# Altium integrated library Integrated_Library-Foxou.IntLib: 69 symbols
Pins are listed as number, name and electrical type; pins without a type are passive.

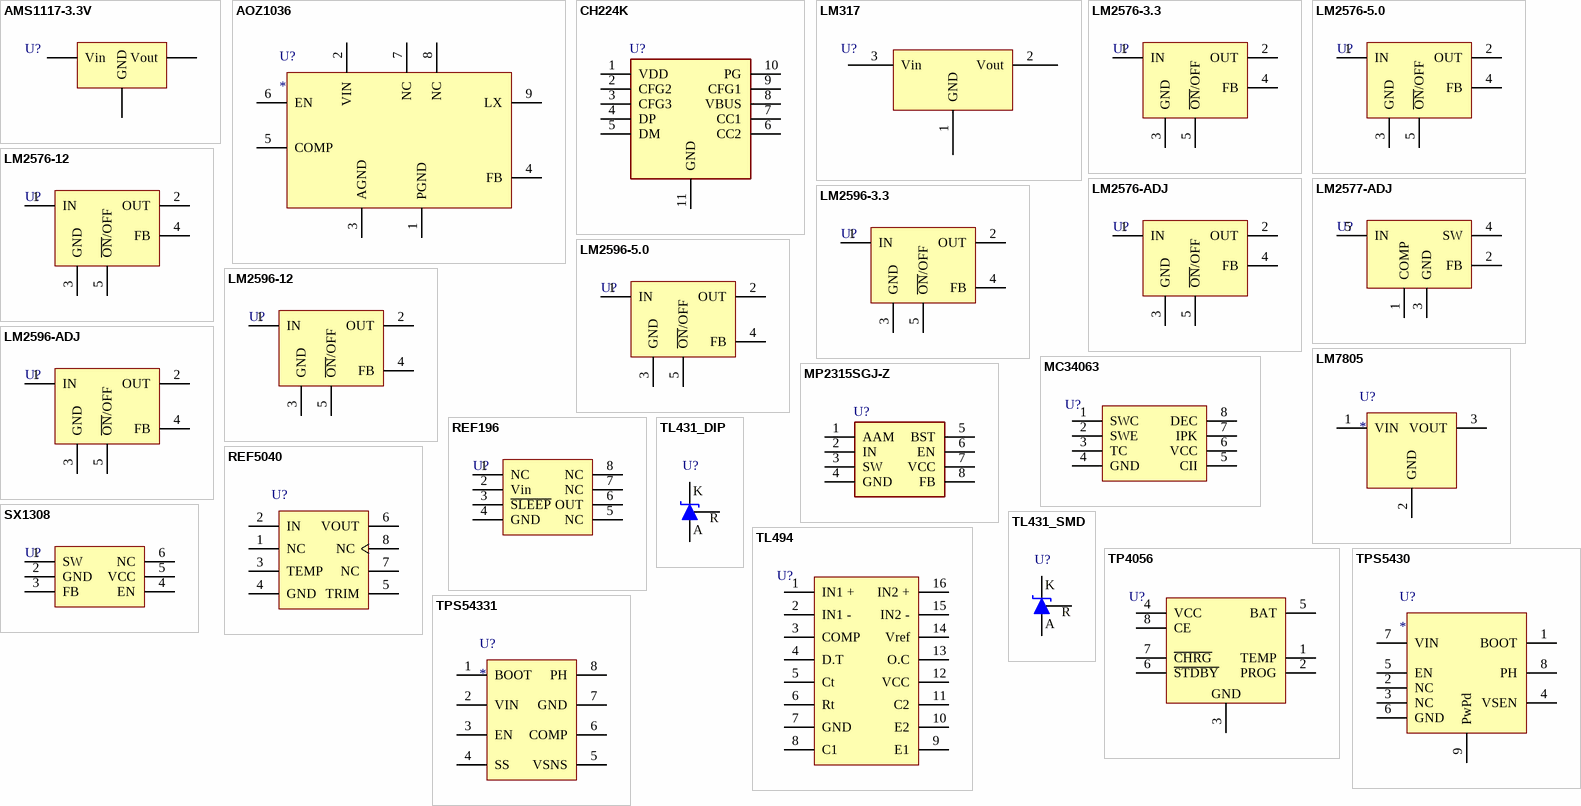
[diagram p0: symbols AMS1117-3.3V to TPS54331]

## AMS1117-3.3V
designator U?
low dropout three-terminal regulators
footprint SOT-223 (Footprint not found)
pins: 1 GND, 2 Vout, 3 Vin

## AOZ1036
designator U?
footprint SOP8-Pad
pins: 1 PGND, 2 VIN, 3 AGND, 4 FB, 5 COMP, 6 EN, 7 NC, 8 NC, 9 LX

## CH224K
designator U?
ESSOP-10 USB ICs ROHS; Manufacturer_Name: WCH; Manufacturer_Part_Number: CH224K; Geometry.Height: 1.8mm; Mouser Part Number: *; Mouser Price/Stock: *; Arrow Part Number: *; Arrow Price/Stock: *; Datasheet Link: https://datasheet.lcsc.com/lcsc/2204251615_WCH-Jiangsu-Qin-Heng-CH224K_C970725.pdf
footprint SOP-10-EP (SOP-8 (Exposed Pad))
pins: 1 VDD, 2 CFG2, 3 CFG3, 4 DP, 5 DM, 6 CC2, 7 CC1, 8 VBUS, 9 CFG1, 10 PG, 11 GND

## LM317
designator U?
footprint TO263
pins: 1 GND, 2 Vout, 3 Vin

## LM2576-3.3
designator U?
DC降压芯片
footprint TO263-5A (263，5脚晶体管)
footprint TO220-5A
pins: 1 IN (power), 2 OUT (power), 3 GND (power), 4 FB, 5 ~{ON}/OFF

## LM2576-5.0
designator U?
DC降压芯片
footprint TO220-5A
footprint TO263-5A (263，5脚晶体管)
pins: 1 IN (power), 2 OUT (power), 3 GND (power), 4 FB, 5 ~{ON}/OFF

## LM2576-12
designator U?
DC降压芯片
footprint TO220-5A
footprint TO263-5A (263，5脚晶体管)
pins: 1 IN (power), 2 OUT (power), 3 GND (power), 4 FB, 5 ~{ON}/OFF

## LM2576-ADJ
designator U?
DC降压芯片
footprint TO220-5A
footprint TO263-5A (263，5脚晶体管)
pins: 1 IN (power), 2 OUT (power), 3 GND (power), 4 FB, 5 ~{ON}/OFF

## LM2577-ADJ
designator U?
DC升压芯片
footprint TO263-5A (263，5脚晶体管)
pins: 1 COMP, 2 FB, 3 GND, 4 SW (power), 5 IN (power)

## LM2596-3.3
designator U?
DC降压芯片
footprint TO263-5A (263，5脚晶体管)
pins: 1 IN (power), 2 OUT (power), 3 GND (power), 4 FB, 5 ~{ON}/OFF

## LM2596-5.0
designator U?
DC降压芯片
footprint TO263-5A (263，5脚晶体管)
pins: 1 IN (power), 2 OUT (power), 3 GND (power), 4 FB, 5 ~{ON}/OFF

## LM2596-12
designator U?
DC降压芯片
footprint TO263-5A (263，5脚晶体管)
pins: 1 IN (power), 2 OUT (power), 3 GND (power), 4 FB, 5 ~{ON}/OFF

## LM2596-ADJ
designator U?
footprint TO263-5A (263，5脚晶体管)
pins: 1 IN (power), 2 OUT (power), 3 GND (power), 4 FB, 5 ~{ON}/OFF

## LM7805
designator U?
footprint TO252 (252晶体管)
pins: 1 VIN, 2 GND, 3 VOUT

## MC34063
designator U?
footprint DIP8
footprint DIP8_SS (DIP8-SMD Socket)
footprint SOP8
pins: 1 SWC, 2 SWE, 3 TC, 4 GND, 5 CII, 6 VCC, 7 IPK, 8 DEC

## MP2315SGJ-Z
designator U?
Switching Voltage Regulators 3A 24V Hi Effc.Sync Step Down Converter; Manufacturer_Name: Monolithic Power Systems (MPS); Manufacturer_Part_Number: MP2315SGJ-Z; Geometry.Height: 1mm; Mouser Part Number: 946-MP2315SGJ-Z; Mouser Price/Stock: https://www.mouser.co.uk/ProductDetail/Monolithic-Power-Systems-MPS/MP2315SGJ-Z?qs=Zwj7mHVHPHQK3n9ExaDQiw%3D%3D; Arrow Part Number: *; Arrow Price/Stock: *; Datasheet Link: https://componentsearchengine.com/Datasheets/1/MP2315SGJ-Z.pdf
footprint TSOT-23-8
pins: 1 AAM, 2 IN, 3 SW, 4 GND, 5 BST, 6 EN, 7 VCC, 8 FB

## REF196
designator U?
3V3基准电压源
footprint SOP8
pins: 1 NC, 2 Vin, 3 ~{SLEEP}, 4 GND, 5 NC, 6 OUT, 7 NC, 8 NC

## REF5040
designator U?
高精度电压基准
footprint SOP8
pins: 1 NC, 2 IN, 3 TEMP, 4 GND, 5 TRIM, 6 VOUT, 7 NC, 8 NC

## SX1308
designator U?
可调升压芯片
footprint SOT23-6
pins: 1 SW, 2 GND, 3 FB, 4 EN, 5 VCC, 6 NC

## TL431_DIP
designator U?
可调基准稳压芯片
pins: A, K, R

## TL431_SMD
designator U?
可调基准稳压芯片
footprint SOT89
pins: A, K, R

## TL494
designator U?
电源管理IC
footprint DIP16
footprint DIP16_SS (DIP16-SMD Socket)
pins: 1 IN1 +, 2 IN1 -, 3 COMP, 4 D.T, 5 Ct, 6 Rt, 7 GND, 8 C1, 9 E1, 10 E2, 11 C2, 12 VCC, 13 O.C, 14 Vref, 15 IN2 -, 16 IN2 +

## TP4056
designator U?
footprint SOP8
pins: 1 TEMP, 2 PROG, 3 GND, 4 VCC, 5 BAT, 6 ~{STDBY}, 7 ~{CHRG}, 8 CE

## TPS5430
designator U?
footprint SOP8-Pad
pins: 1 BOOT, 2 NC, 3 NC, 4 VSEN, 5 EN, 6 GND, 7 VIN, 8 PH, 9 PwPd

## TPS54331
designator U?
footprint SOP8-Pad
pins: 1 BOOT, 2 VIN, 3 EN, 4 SS, 5 VSNS, 6 COMP, 7 GND, 8 PH


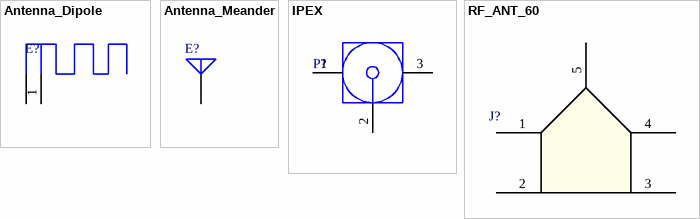
[diagram p1: symbols Antenna_Dipole to RF_ANT_60]

## Antenna_Dipole
designator E?
Dipole Antenna; Published: 24-Mar-1999; LatestRevisionDate: 17-Jul-2002; LatestRevisionNote: Re-released for DXP Platform.; PackageReference: PIN1; Publisher: Altium Limited
footprint ANT-PCB-2.4G-IFA-AN043(Left Feed) (COMPACT 14x5 TI-ORIGIN)
pins: 1 WIFI-ANT, 2 GND

## Antenna_Meander
designator E?
Meander Antenna; Published: 24-Mar-1999; LatestRevisionDate: 17-Jul-2002; LatestRevisionNote: Re-released for DXP Platform.; PackageReference: PIN1; Publisher: Altium Limited
footprint ANT-PCB-2.4G-MLA (Meander Line Antenna)
pins: 1 A

## IPEX
designator P?
RF Coaxial PCB Connector, MCX; Thru-Hole, Right-Angle Mount Socket, Blunt Post Terminal, 50 Ohm Impedance; PCB_Layout: Complies with manufacturer's recommendation.; DrillSize: Corresponds to nominal value.; Published: 15-Jul-2004; LatestRevisionDate: 15-Jul-2004; LatestRevisionNote: Component Replaced.; DatasheetDocument: 30-May-2003; PackageDocument: 04-Jul-1999; PackageReference: 919-119J-51AX; Publisher: Altium Limited; ComponentLink1Description: Manufacturer Link; ComponentLink1URL: http://www.amphenolrf.com/
footprint IPEX
pins: 1 "Signal Pin", 2 "Signal Pin", 3 "Signal Pin"

## RF_ANT_60
designator J?
Antenna Connector
footprint SMA-KWE/90°
pins: 1, 2, 3, 4, 5


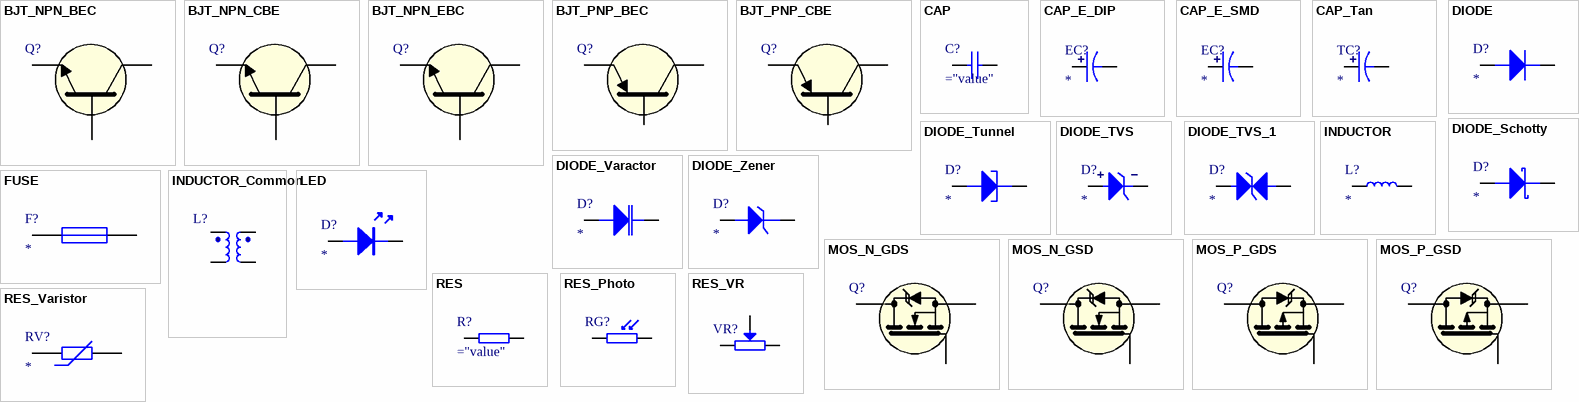
[diagram p2: symbols BJT_NPN_BEC to RES_VR]

## BJT_NPN_BEC
designator Q?
Bipolar Junction Transistor NPN
footprint SOT-23-3
pins: 1 B, 2 E, 3 C

## BJT_NPN_CBE
designator Q?
Bipolar Junction Transistor NPN
footprint SOT-23-3
pins: 1 C, 2 B, 3 E

## BJT_NPN_EBC
designator Q?
Bipolar Junction Transistor NPN
footprint SOT-23-3
pins: 1 E, 2 B, 3 C

## BJT_PNP_BEC
designator Q?
Bipolar Junction Transistor PNP
footprint SOT-23-3
pins: 1 E, 2 B, 3 C

## BJT_PNP_CBE
designator Q?
Bipolar Junction Transistor PNP
footprint SOT-23-3
pins: 1 C, 2 B, 3 E

## CAP
designator C?
Non-polar capacitor
footprint C0603
pins: 1, 2

## CAP_E_DIP
designator EC?
Through-hole Electrolytic Capacitor
pins: 1, 2

## CAP_E_SMD
designator EC?
Surface-mount Electrolytic Capacitor
pins: 1, 2

## CAP_Tan
designator TC?
Tantalum Capacitor
pins: 1, 2

## DIODE
designator D?
DIODE
footprint DO-41G
footprint DO-41GV
footprint DO-41V
footprint DO-201AD
footprint DO-201ADV
footprint LL34 (玻封二极管)
footprint SMA/DO-214AC (塑封二极管)
footprint SMB/DO-214AA (塑封二极管)
footprint SOD-123 (塑封二极管)
footprint SOD-323 (塑封二极管)
footprint SOD-523 (塑封二极管)
pins: 1 A, 2 K

## DIODE_Schotty
designator D?
SCHOTTKY DIODE
footprint SOD-123 (塑封二极管)
footprint SOD-323 (塑封二极管)
footprint SOD-523 (塑封二极管)
pins: 1 A, 2 K

## DIODE_Tunnel
designator D?
TUNNEL DIODE
pins: 1 A, 2 K

## DIODE_TVS
designator D?
Uni-Directional Unit TVS
pins: 1 A, 2 K

## DIODE_TVS_1
designator D?
Bi-Directional Unit TVS
pins: 1 A, 2 K

## DIODE_Varactor
designator D?
VARACTOR DIODE
pins: 1 A, 2 K

## DIODE_Zener
designator D?
ZENER DIODE
pins: 1 A, 2 K

## FUSE
designator F?
FUSE,FUSE-LINK
pins: 1, 2

## INDUCTOR
designator L?
INDUCTOR
footprint CD32 (3.5*3*2mm（长宽高）)
footprint CD42 (4.5*4*2mm（长宽高）)
footprint CD43 (4.5*4*3.2mm（长宽高）)
footprint CD52 (5.8*5.2*3mm（长宽高）)
footprint CD53 (5.8*5.2*3.5mm（长宽高）)
footprint CD54 (5.8*5.2*4.5mm（长宽高）)
footprint CD75 (7.8*7*5mm（长宽高）)
footprint CD104 (10*9*4mm（长宽高）)
footprint CD105 (10*9*5.4mm（长宽高）)
footprint CD106 (10*9*6.5mm（长宽高）)
footprint CDRH73 (7.3*7.3*3.4mm（长宽高）)
footprint CDRH74 (7.3*7.3*4.5mm（长宽高）)
footprint CDRH124 (12*12*4.5mm（长宽高）)
footprint CDRH125 (12*12*5mm（长宽高）)
footprint CDRH127 (12*12*8mm（长宽高）)
footprint CDRH129 (12*12*9.5mm（长宽高）)
footprint L0630
footprint NR3015 (3mm*3mm*1.5mm(长*宽*高）)
footprint PK0406 (2*5*8mm(脚距，直径，高）)
footprint PK0608 (2.5*7*10mm(脚距，直径，高）)
footprint PK0810 (5*9*12mm(脚距，直径，高）)
footprint PK0912 (6*10*14mm(脚距，直径，高）)
footprint PK1012 (6*11*14mm(脚距，直径，高）)
footprint PK1415 (7.5*15*17mm(脚距，直径，高）)
footprint PK1618 (12.5*17*20mm(脚距，直径，高）)
footprint PK1818 (15*19*20mm(脚距，直径，高）)
footprint L0402
footprint L0603
footprint L0630
footprint L0805
footprint L1210
footprint L1806
footprint L1812
pins: 1, 2

## INDUCTOR_Common
designator L?
Common Mode Choke
pins: 1, 1 2, 2 4, 2 3

## LED
designator D?
Light Emitting Diode
footprint LED-0603B
footprint LED-0603G
footprint LED-0805R
footprint LED-0603W
footprint LED-0603Y
footprint LED-0805B
footprint LED-0805G
footprint LED-0805R
footprint LED-0603W
footprint LED-0805Y
footprint LED-1206B
footprint LED-1206G
footprint LED-1206R
footprint LED-1206W
footprint LED-1206Y
pins: 1 A, 2 K

## MOS_N_GDS
designator Q?
Metal-Oxide-Semiconductor Field-Effect Transistor N
pins: 1 G, 2 D, 3 S

## MOS_N_GSD
designator Q?
Metal-Oxide-Semiconductor Field-Effect Transistor N
pins: 1 G, 2 S, 3 D

## MOS_P_GDS
designator Q?
Metal-Oxide-Semiconductor Field-Effect Transistor N
pins: 1 G, 2 D, 3 S

## MOS_P_GSD
designator Q?
Metal-Oxide-Semiconductor Field-Effect Transistor N
pins: 1 G, 2 S, 3 D

## RES
designator R?
Resistor
footprint R0603 (1/10W (0.1W))
pins: 1, 2

## RES_Photo
designator RG?
Photoresistor/Light-dependent resistor
pins: 1, 2

## RES_Varistor
designator RV?
Voltage Dependent Resistor
pins: 1, 2

## RES_VR
designator VR?
Variable Resistor
pins: 1, 2, 2


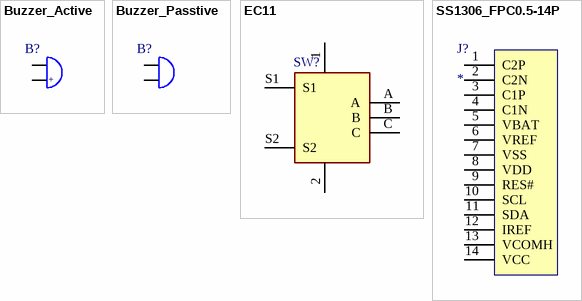
[diagram p3: symbols Buzzer_Active to SS1306_FPC0.5-14P]

## Buzzer_Active
designator B?
Active Buzzer
footprint BEEP 7.6x12x9.5
pins: 1, 2
text: +

## Buzzer_Passtive
designator B?
Passtive Buzzer
pins: 1, 2

## EC11
designator SW?
Alps 15 Pulse Incremental Mechanical Rotary Encoder with a 5.975 mm Flat Shaft (Not Indexed), SMD; Manufacturer_Name: ALPS Electric; Manufacturer_Part_Number: EC11J1525602; Geometry.Height: 24.5mm; Mouser Part Number: *; Mouser Price/Stock: *; Arrow Part Number: *; Arrow Price/Stock: *; Datasheet Link: https://www.tme.eu/Document/0ebbc64ade625a62b285b77e718a2ac7/ALPS-EC11J.pdf
footprint SMD EC11 8mm
pins: 1, 2, A, B, C, S1, S2

## SS1306_FPC0.5-14P
designator J?
0.91inch OLED Module
footprint OLED 0.91 (Footprint not found)
pins: 1 C2P, 2 C2N, 3 C1P, 4 C1N, 5 VBAT, 6 VREF, 7 VSS, 8 VDD, 9 RES#, 10 SCL, 11 SDA, 12 IREF, 13 VCOMH, 14 VCC


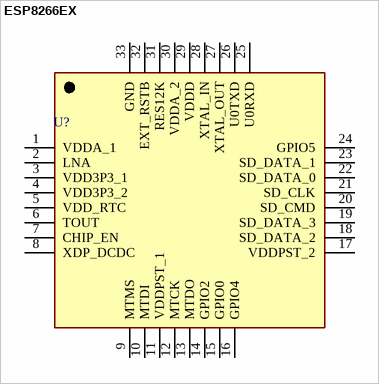
[diagram p4: symbol ESP8266EX]

## ESP8266EX
designator U?
Wi-Fi Alliance; Manufacturer_Name: Espressif Systems; Manufacturer_Part_Number: ESP8266; Geometry.Height: 0.9mm; Mouser Part Number: *; Mouser Price/Stock: *; Arrow Part Number: *; Arrow Price/Stock: *; Datasheet Link: https://www.espressif.com/sites/default/files/documentation/0a-esp8266ex_datasheet_en.pdf
footprint QFN-32-EP(5x5) (Footprint not found)
pins: 1 VDDA_1, 2 LNA, 3 VDD3P3_1, 4 VDD3P3_2, 5 VDD_RTC, 6 TOUT, 7 CHIP_EN, 8 XDP_DCDC, 9 MTMS, 10 MTDI, 11 VDDPST_1, 12 MTCK, 13 MTDO, 14 GPIO2, 15 GPIO0, 16 GPIO4, 17 VDDPST_2, 18 SD_DATA_2, 19 SD_DATA_3, 20 SD_CMD, 21 SD_CLK, 22 SD_DATA_0, 23 SD_DATA_1, 24 GPIO5, 25 U0RXD, 26 U0TXD, 27 XTAL_OUT, 28 XTAL_IN, 29 VDDD, 30 VDDA_2, 31 RES12K, 32 EXT_RSTB, 33 GND


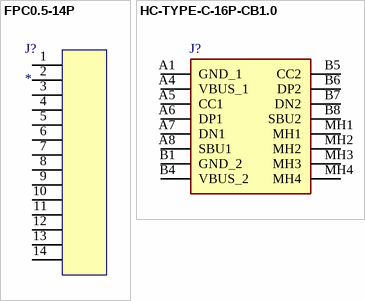
[diagram p5: symbols FPC0.5-14P to HC-TYPE-C-16P-CB1.0]

## FPC0.5-14P
designator J?
0.5Inch FPC Connector
footprint FPC0.5-14P
pins: 1, 2, 3, 4, 5, 6, 7, 8, 9, 10, 11, 12, 13, 14

## HC-TYPE-C-16P-CB1.0
designator J?
3A 1 Sink panel 16P Female -25~+85 Type-C SMD USB Connectors ROHS; Manufacturer_Name: hanxia; Manufacturer_Part_Number: HC-TYPE-C-16P-CB1.0; Geometry.Height: 3.36mm; Mouser Part Number: *; Mouser Price/Stock: *; Arrow Part Number: *; Arrow Price/Stock: *; Datasheet Link: https://www.lcsc.com/datasheet/lcsc_datasheet_2211161000_HCTL-HC-TYPE-C-16P-CB1-0_C2894901.pdf
footprint SMD TYPEC16P
pins: A1 GND_1, A4 VBUS_1, A5 CC1, A6 DP1, A7 DN1, A8 SBU1, B1 GND_2, B4 VBUS_2, B5 CC2, B6 DP2, B7 DN2, B8 SBU2, MH1, MH2, MH3, MH4


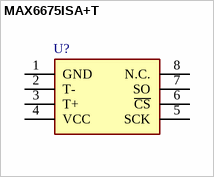
[diagram p6: symbol MAX6675ISA+T]

## MAX6675ISA+T
designator U?
Sensor Interface Cold-Junction-Compensated K-Thermocouple-to-Digital Converter (0 C to +1024 C); Manufacturer_Name: Analog Devices; Manufacturer_Part_Number: MAX6675ISA+T; Geometry.Height: 1.75mm; Mouser Part Number: 700-MAX6675ISAT; Mouser Price/Stock: https://www.mouser.co.uk/ProductDetail/Analog-Devices-Maxim-Integrated/MAX6675ISA%2bT?qs=1THa7WoU59FV%2FT3S8QjZ%252Bg%3D%3D; Arrow Part Number: MAX6675ISA+T; Arrow Price/Stock: https://www.arrow.com/en/products/max6675isat/analog-devices?utm_currency=USD&region=nac; Datasheet Link: https://datasheets.maximintegrated.com/en/ds/MAX6675.pdf
footprint SOP-8
pins: 1 GND, 2 T-, 3 T+, 4 VCC, 5 SCK, 6 ~{CS}, 7 SO, 8 N.C.


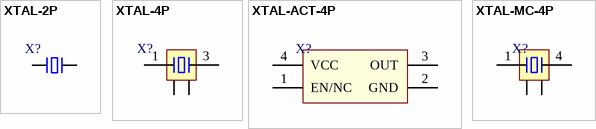
[diagram p7: symbols XTAL-2P to XTAL-MC-4P]

## XTAL-2P
designator X?
Passive Crystal  Crystal Resonator
pins: 1, 2

## XTAL-4P
designator X?
Active Crystal Oscillator
pins: 1, 2, 3, 4

## XTAL-ACT-4P
designator X?
Active Crystal Oscillator
pins: 1 EN/NC, 2 GND, 3 OUT, 4 VCC

## XTAL-MC-4P
designator X?
Passive Crystal Crystal Resonator
pins: 1, 2, 3, 4